# Altium footprint library 集大电协1.5.PcbLib: 227 footprints (part 18 of 18) (continued)
## 琴_LOGO [mm] (continued)

## 电力载波模块6410 [mm]
pads (24):
  round 1.3 hole 0.8: 0(35.059,-32.289) 0(35.059,-30.289) 0(35.059,-28.289) 0(35.059,-26.289) 0(35.059,-24.289) 0(35.059,-22.289) 0(35.059,-20.289) 0(35.059,-16.289) 2(1.059,-12.289) 3(1.059,-14.289) 4(1.059,-16.289) 5(1.059,-18.289) 6(1.059,-20.289) 7(1.059,-22.289) 8(1.059,-24.289) 9(1.059,-26.289) 10(1.059,-28.289) 11(1.059,-30.289) 12(1.059,-32.289) 13(35.059,-18.289) 14(35.059,-14.289) 15(35.059,-12.289) 16(35.059,-10.289)
  rect 1.3x1.3 hole 0.8: 1(1.059,-10.289)
Top Overlay:
  circle w0.254: c5,-7.5 r1.581
  lines w0.2: -0.016,-29.489 -0.016,-9.089 2.134,-9.089 2.134,-29.489 ; -0.016,-29.089 -0.016,-33.489 2.134,-33.489 2.134,-29.089 ; 33.984,-29.489 33.984,-9.089 36.134,-9.089 36.134,-29.489 ; 33.984,-29.089 33.984,-33.489 36.134,-33.489 36.134,-29.089
  lines w0.254: 16.5,0 16.5,-8.5 ccw(c17,-8.5) 17,-9 31,-9 ccw(c31,-8.5) 31.5,-8.5 31.5,0 ; 24.181,-9.068 24.181,-16.561 24.206,-16.561 25.908,-18.263 25.908,-19.279 25.908,-21.59 ; 25.933,-21.615 25.908,-21.59 ; 29.159,-9.144 29.159,-11.76 31.064,-13.665 31.064,-23.52 27.813,-23.52 25.908,-21.615 25.908,-21.59 ; -0.5,-37.5 ccw(c0.5,-37.5) 0.5,-38.5 35.5,-38.5 ccw(c35.5,-37.5) 36.5,-37.5 36.5,-1 ccw(c35.5,-1) 35.5,0 0.5,0 ccw(c0.5,-1) -0.5,-1 -0.5,-37.5
  text "NC" at 32.182,-14.63 h1.4
  text "NC" at 32.156,-12.675 h1.4
  text "AC/L" at 31.242,-18.745 h1.4
  text "AC/N" at 30.963,-10.541 h1.4
  text "GND" at 2.642,-32.766 h1.52
  text "12V" at 2.64,-30.773 h1.52
  text "RXN" at 2.54,-28.867 h1.52
  text "RXP" at 2.54,-26.86 h1.52
  text "TXN" at 2.542,-24.854 h1.52
  text "TXP" at 2.542,-22.847 h1.52
  text "3.3V" at 2.54,-20.826 h1.52
  text "PWR" at 2.54,-18.834 h1.52
  text "PLC" at 2.54,-16.813 h1.52
  text "ETH" at 2.54,-14.821 h1.52
  text "RST" at 2.54,-12.8 h1.52
  text "GND" at 2.642,-10.693 h1.52
Mechanical 13:
  lines w0.1: 0.059,-29.289 2.059,-29.289 ; 0.059,-29.289 0.059,-33.289 2.059,-33.289 2.059,-29.289 ; 0.059,-29.289 0.059,-9.289 2.059,-9.289 2.059,-29.289 ; 0.059,-29.289 2.059,-29.289 ; 34.059,-29.289 36.059,-29.289 ; 34.059,-29.289 34.059,-9.289 36.059,-9.289 36.059,-29.289 ; 34.059,-29.289 34.059,-33.289 36.059,-33.289 36.059,-29.289 ; 34.059,-29.289 36.059,-29.289
Mechanical 15:
  lines w0.05: 0.559,-31.289 1.559,-31.289 ; 0.559,-19.289 1.559,-19.289 ; 1.059,-31.789 1.059,-30.789 ; 1.059,-19.789 1.059,-18.789 ; 34.559,-31.289 35.559,-31.289 ; 34.559,-19.289 35.559,-19.289 ; 35.059,-31.789 35.059,-30.789 ; 35.059,-19.789 35.059,-18.789 ; -0.216,-33.689 -0.216,-28.889 2.334,-28.889 2.334,-33.689 -0.216,-33.689 ; -0.216,-29.689 -0.216,-8.889 2.334,-8.889 2.334,-29.689 -0.216,-29.689 ; 33.784,-33.689 36.334,-33.689 36.334,-28.889 33.784,-28.889 33.784,-33.689 ; 33.784,-29.689 36.334,-29.689 36.334,-8.889 33.784,-8.889 33.784,-29.689
3D body "62001011821.stp": height 4.35, standoff -2.65, extent 33.897,-29.42 36.397,-8.92
3D body "62000211821.stp": height 4.35, standoff -2.65, extent 33.887,-33.466 36.387,-28.966
3D body "62000211821.stp": height 4.35, standoff -2.65, extent -0.149,-33.416 2.351,-28.916
3D body "62001011821.stp": height 4.35, standoff -2.65, extent -0.139,-29.369 2.361,-8.869

## 电感 [mm]
pads (2):
  rect 2x2.5 smd: 1(-0.12,-0.044) 2(7.423,-0.069)
Top Overlay:
  lines w0.254: 0.19,-3.167 0.44,-3.417 6.69,-3.417 7.175,-2.932 7.175,3.098 6.69,3.583 0.69,3.583 0.19,3.083 0.19,-3.167
3D body "User Library-Inductor VLC6045 Series.STEP": height 4.5, standoff 0, extent 0.636,-2.981 6.636,3.019

## 电感 220uH(大) [mm]
pads (2):
  rect 5x10 smd: 1(-0.444,0.06) 2(-8.944,0.06)
Top Overlay:
  lines w0.127: -11.62,-6.09 -11.62,6.41 2.325,6.41 2.325,-6.09 -11.62,-6.09
3D body: height 4, standoff 0, extent -8.597,-3.279 -1.485,3.833

## 电量显示 [mm]
Top Layer:
  lines w0.051: -2.794,-4.445 -2.235,-4.445 ; -2.794,-4.394 -2.286,-4.394 ; -2.794,-4.343 -2.286,-4.343 ; -2.794,-4.293 -2.286,-4.293 ; -2.794,-4.242 -2.286,-4.242 ; -2.794,-4.191 -2.286,-4.191 ; -2.794,-4.14 -2.286,-4.14 ; -2.794,-4.089 -2.286,-4.089 ; -2.794,-4.039 -2.286,-4.039 ; -2.794,-3.988 -2.286,-3.988 ; -2.794,-3.937 -2.286,-3.937 ; -2.794,-3.886 -2.286,-3.886 ; -2.794,-3.835 -2.286,-3.835 ; -2.794,-3.785 -2.286,-3.785 ; -2.794,-3.734 -2.286,-3.734 ; -2.794,-3.683 -2.286,-3.683 ; -2.794,-3.632 -2.286,-3.632 ; -2.794,-3.581 -2.286,-3.581 ; -2.794,-3.531 -2.286,-3.531 ; -2.794,-3.48 -2.286,-3.48 ; -2.794,-3.429 -2.286,-3.429 ; -2.794,-3.378 -2.286,-3.378 ; -2.794,-3.327 -2.286,-3.327 ; -2.794,-3.277 -2.286,-3.277 ; -2.794,-3.226 -2.286,-3.226 ; -2.794,-3.175 -2.286,-3.175 ; -2.794,-3.124 -2.286,-3.124 ; -2.794,-3.073 -2.286,-3.073 ; -2.794,-3.023 -2.286,-3.023 ; -2.794,-2.972 -2.286,-2.972 ; -2.794,-2.921 -2.286,-2.921 ; -2.794,-2.87 -2.286,-2.87 ; -2.794,-2.819 -2.286,-2.819 ; -2.794,-2.769 -2.286,-2.769 ; -2.794,-2.718 -2.286,-2.718 ; -2.794,-2.667 -2.286,-2.667 ; -2.794,-2.616 -2.286,-2.616 ; -2.794,-2.565 -2.286,-2.565 ; -2.794,-2.515 -2.286,-2.515 ; -2.794,-2.464 -2.286,-2.464 ; -2.794,-2.413 -2.286,-2.413 ; -2.794,-2.362 -2.286,-2.362 ; -2.794,-2.311 -2.286,-2.311 ; -2.794,-2.261 -2.286,-2.261 ; -2.794,-2.21 -2.286,-2.21 ; -2.794,-2.159 -2.286,-2.159 ; -2.794,-2.108 -2.286,-2.108 ; -2.794,-2.057 -2.286,-2.057 ; -2.794,-2.007 -2.286,-2.007 ; -2.794,-1.956 -2.286,-1.956 ; -2.794,-1.905 -2.286,-1.905 ; -2.794,-1.854 -2.286,-1.854 ; -2.794,-1.803 -2.286,-1.803 ; -2.794,-1.753 -2.286,-1.753 ; -2.794,-1.702 -2.286,-1.702 ; -2.794,-1.651 -2.286,-1.651 ; -2.794,-1.6 -2.286,-1.6 ; -2.794,-1.549 -2.286,-1.549 ; -2.794,-1.499 -2.286,-1.499 ; -2.794,-1.448 -2.286,-1.448 ; -2.794,-1.397 -2.286,-1.397 ; -2.794,-1.346 -2.286,-1.346 ; -2.794,-1.295 -2.286,-1.295 ; -2.794,-1.245 -2.286,-1.245 ; -2.794,-1.194 -2.286,-1.194 ; -2.794,-1.143 -2.286,-1.143 ; -2.794,-1.092 -2.286,-1.092 ; -2.794,-1.041 -2.286,-1.041 ; -2.794,-0.991 -2.286,-0.991 ; -2.794,-0.94 -2.286,-0.94 ; -2.794,-0.889 -2.286,-0.889 ; -2.794,-0.838 -2.286,-0.838 ; -2.794,-0.787 -2.286,-0.787 ; -2.794,-0.737 -2.286,-0.737 ; -2.794,-0.686 -2.286,-0.686 ; -2.794,-0.635 -2.286,-0.635 ; -2.794,-0.584 -2.286,-0.584 ; -2.794,-0.533 -2.286,-0.533 ; -2.794,-0.483 -2.286,-0.483 ; -2.794,-0.432 -2.286,-0.432 ; -2.794,-0.381 -2.286,-0.381 ; -2.794,-0.33 -2.286,-0.33 ; -2.794,-0.279 -2.286,-0.279 ; -2.794,-0.229 -2.286,-0.229 ; -2.794,-0.178 -2.286,-0.178 ; -2.794,-0.127 -2.286,-0.127 ; -2.794,-0.076 -2.286,-0.076 ; -2.794,-0.025 -2.286,-0.025 ; -2.794,0.025 -2.286,0.025 ; -2.794,0.076 -2.286,0.076 ; -2.794,0.127 -2.286,0.127 ; -2.794,0.178 -2.286,0.178 ; -2.794,0.229 -2.286,0.229 ; -2.794,0.279 -2.286,0.279 ; -2.794,0.33 -2.286,0.33 ; -2.794,0.381 -2.286,0.381 ; -2.794,0.432 -2.286,0.432 ; -2.794,0.483 -2.286,0.483 ; -2.794,0.533 -2.286,0.533 ; -2.794,0.584 -2.286,0.584 ; -2.794,0.635 -2.286,0.635 ; -2.794,0.686 -2.286,0.686 ; -2.794,0.737 -2.286,0.737 ; -2.794,0.787 -2.286,0.787 ; -2.794,0.838 -2.286,0.838 ; -2.794,0.889 -2.286,0.889 ; -2.794,0.94 -2.286,0.94 ; -2.794,0.991 -2.286,0.991 ; -2.794,1.041 -2.286,1.041 ; -2.794,1.092 -2.286,1.092 ; -2.794,1.143 -2.286,1.143 ; -2.794,1.194 -2.286,1.194 ; -2.794,1.245 -2.286,1.245 ; -2.794,1.295 -2.286,1.295 ; -2.794,1.346 -2.286,1.346 ; -2.794,1.397 -2.286,1.397 ; -2.794,1.448 -2.286,1.448 ; -2.794,1.499 -2.286,1.499 ; -2.794,1.549 -2.286,1.549 ; -2.794,1.6 -2.286,1.6 ; -2.794,1.651 -2.286,1.651 ; -2.794,1.702 -2.286,1.702 ; -2.794,1.753 -2.286,1.753 ; -2.794,1.803 -2.286,1.803 ; -2.794,1.854 -2.286,1.854 ; -2.794,1.905 -2.286,1.905 ; -2.794,1.956 -2.286,1.956 ; -2.794,2.007 -2.286,2.007 ; -2.794,2.057 -2.286,2.057 ; -2.794,2.108 -2.286,2.108 ; -2.794,2.159 -2.286,2.159 ; -2.794,2.21 -2.286,2.21 ; -2.794,2.261 -2.286,2.261 ; -2.794,2.311 -2.286,2.311 ; -2.794,2.362 -2.286,2.362 ; -2.794,2.413 -2.286,2.413 ; -2.794,2.464 -2.286,2.464 ; -2.794,2.515 -2.286,2.515 ; -2.794,2.565 -2.286,2.565 ; -2.794,2.616 -2.286,2.616 ; -2.794,2.667 -2.286,2.667 ; -2.794,2.718 -2.286,2.718 ; -2.794,2.769 -2.286,2.769 ; -2.794,2.819 -2.286,2.819 ; -2.794,2.87 -2.286,2.87 ; -2.794,2.921 -2.286,2.921 ; -2.794,2.972 -2.286,2.972 ; -2.794,3.023 -2.286,3.023 ; -2.794,3.073 -2.286,3.073 ; -2.794,3.124 -2.286,3.124 ; -2.794,3.175 -2.286,3.175 ; -2.794,3.226 -2.286,3.226 ; -2.794,3.277 -2.286,3.277 ; -2.794,3.327 -2.286,3.327 ; -2.794,3.378 -2.286,3.378 ; -2.794,3.429 -2.286,3.429 ; -2.794,3.48 -2.286,3.48 ; -2.794,3.531 -2.286,3.531 ; -2.794,3.581 -2.235,3.581 ; -2.743,-4.597 -2.083,-4.597 ; -2.743,-4.547 -2.134,-4.547 ; -2.743,-4.496 -2.184,-4.496 ; -2.743,3.632 -2.184,3.632 ; -2.743,3.683 -2.134,3.683 ; -2.692,-4.699 2.489,-4.699 ; -2.692,-4.648 -1.93,-4.648 ; -2.692,3.734 -2.083,3.734 ; -2.692,3.785 -1.88,3.785 ; -2.642,-4.75 2.489,-4.75 ; -2.642,3.835 2.489,3.835 ; -2.642,3.886 2.438,3.886 ; -2.591,-4.801 2.438,-4.801 ; -2.591,3.937 2.388,3.937 ; -2.54,-4.902 2.337,-4.902 ; -2.54,-4.851 2.388,-4.851 ; -2.54,3.988 2.388,3.988 ; -2.489,4.039 2.337,4.039 ; -2.438,-4.953 2.286,-4.953 ; -2.438,4.089 2.235,4.089 ; -2.388,-5.004 2.184,-5.004 ; -2.388,4.14 2.184,4.14 ; -2.286,-5.055 2.134,-5.055 ; -2.286,4.191 2.083,4.191 ; -2.184,-5.105 2.032,-5.105 ; -2.134,4.242 1.981,4.242 ; -1.981,-4.293 1.829,-4.293 ; -1.981,-4.242 1.829,-4.242 ; -1.981,-4.191 1.829,-4.191 ; -1.981,-4.14 1.829,-4.14 ; -1.981,-4.089 1.829,-4.089 ; -1.981,-4.039 1.829,-4.039 ; -1.981,-3.988 1.829,-3.988 ; -1.981,-3.937 1.829,-3.937 ; -1.981,-3.886 1.829,-3.886 ; -1.981,-3.835 1.829,-3.835 ; -1.981,-3.785 1.829,-3.785 ; -1.981,-3.734 1.829,-3.734 ; -1.981,-3.683 1.829,-3.683 ; -1.981,-3.632 1.829,-3.632 ; -1.981,-3.581 1.829,-3.581 ; -1.981,-3.531 1.829,-3.531 ; -1.981,-3.48 1.829,-3.48 ; -1.981,-3.429 1.829,-3.429 ; -1.981,-3.378 1.829,-3.378 ; -1.981,-3.327 1.829,-3.327 ; -1.981,-3.277 1.829,-3.277 ; -1.981,-3.226 1.829,-3.226 ; -1.981,-3.175 1.829,-3.175 ; -1.981,-3.124 1.829,-3.124 ; -1.981,-3.073 1.829,-3.073 ; -1.981,-2.667 1.829,-2.667 ; -1.981,-2.616 1.829,-2.616 ; -1.981,-2.565 1.829,-2.565 ; -1.981,-2.515 1.829,-2.515 ; -1.981,-2.464 1.829,-2.464 ; -1.981,-2.413 1.829,-2.413 ; -1.981,-2.362 1.829,-2.362 ; -1.981,-2.311 1.829,-2.311 ; -1.981,-2.261 1.829,-2.261 ; -1.981,-2.21 1.829,-2.21 ; -1.981,-2.159 1.829,-2.159 ; -1.981,-2.108 1.829,-2.108 ; -1.981,-2.057 1.829,-2.057 ; -1.981,-2.007 1.829,-2.007 ; -1.981,-1.956 1.829,-1.956 ; -1.981,-1.905 1.829,-1.905 ; -1.981,-1.854 1.829,-1.854 ; -1.981,-1.803 1.829,-1.803 ; -1.981,-1.753 1.829,-1.753 ; -1.981,-1.702 1.829,-1.702 ; -1.981,-1.651 1.829,-1.651 ; -1.981,-1.6 1.829,-1.6 ; -1.981,-1.549 1.829,-1.549 ; -1.981,-1.499 1.829,-1.499 ; -1.981,-1.448 1.829,-1.448 ; -1.981,-1.041 1.829,-1.041 ; -1.981,-0.991 1.829,-0.991 ; -1.981,-0.94 1.829,-0.94 ; -1.981,-0.889 1.829,-0.889 ; -1.981,-0.838 1.829,-0.838 ; -1.981,-0.787 1.829,-0.787 ; -1.981,-0.737 1.829,-0.737 ; -1.981,-0.686 1.829,-0.686 ; -1.981,-0.635 1.829,-0.635 ; -1.981,-0.584 1.829,-0.584 ; -1.981,-0.533 1.829,-0.533 ; -1.981,-0.483 1.829,-0.483 ; -1.981,-0.432 1.829,-0.432 ; -1.981,-0.381 1.829,-0.381 ; -1.981,-0.33 1.829,-0.33 ; -1.981,-0.279 1.829,-0.279 ; -1.981,-0.229 1.829,-0.229 ; -1.981,-0.178 1.829,-0.178 ; -1.981,-0.127 1.829,-0.127 ; -1.981,-0.076 1.829,-0.076 ; -1.981,-0.025 1.829,-0.025 ; -1.981,0.025 1.829,0.025 ; -1.981,0.076 1.829,0.076 ; -1.981,0.127 1.829,0.127 ; -1.981,0.178 1.829,0.178 ; -1.981,0.635 1.829,0.635 ; -1.981,0.686 1.829,0.686 ; -1.981,0.737 1.829,0.737 ; -1.981,0.787 1.829,0.787 ; -1.981,0.838 1.829,0.838 ; -1.981,0.889 1.829,0.889 ; -1.981,0.94 1.829,0.94 ; -1.981,0.991 1.829,0.991 ; -1.981,1.041 1.829,1.041 ; -1.981,1.092 1.829,1.092 ; -1.981,1.143 1.829,1.143 ; -1.981,1.194 1.829,1.194 ; -1.981,1.245 1.829,1.245 ; -1.981,1.295 1.829,1.295 ; -1.981,1.346 1.829,1.346 ; -1.981,1.397 1.829,1.397 ; -1.981,1.448 1.829,1.448 ; -1.981,1.499 1.829,1.499 ; -1.981,1.549 1.829,1.549 ; -1.981,1.6 1.829,1.6 ; -1.981,1.651 1.829,1.651 ; -1.981,1.702 1.829,1.702 ; -1.981,1.753 1.829,1.753 ; -1.981,1.803 1.829,1.803 ; -1.981,1.854 1.829,1.854 ; -1.016,4.293 0.813,4.293 ; -1.016,4.343 0.813,4.343 ; -0.965,4.394 0.813,4.394 ; -0.965,4.445 0.813,4.445 ; -0.965,4.496 0.762,4.496 ; -0.914,4.547 0.711,4.547 ; -0.864,4.597 0.711,4.597 ; -0.813,4.648 0.61,4.648 ; -0.66,4.699 0.508,4.699 ; 1.676,3.785 2.489,3.785 ; 1.778,-4.648 2.54,-4.648 ; 1.88,-4.597 2.54,-4.597 ; 1.88,3.734 2.54,3.734 ; 1.981,-4.547 2.54,-4.547 ; 1.981,3.683 2.54,3.683 ; 2.032,-4.496 2.591,-4.496 ; 2.032,3.581 2.591,3.581 ; 2.032,3.632 2.591,3.632 ; 2.083,-4.445 2.591,-4.445 ; 2.083,-4.394 2.591,-4.394 ; 2.083,-4.343 2.591,-4.343 ; 2.083,3.48 2.591,3.48 ; 2.083,3.531 2.591,3.531 ; 2.134,-4.293 2.591,-4.293 ; 2.134,-4.242 2.591,-4.242 ; 2.134,-4.191 2.591,-4.191 ; 2.134,-4.14 2.591,-4.14 ; 2.134,-4.089 2.591,-4.089 ; 2.134,-4.039 2.591,-4.039 ; 2.134,-3.988 2.591,-3.988 ; 2.134,-3.937 2.591,-3.937 ; 2.134,-3.886 2.591,-3.886 ; 2.134,-3.835 2.591,-3.835 ; 2.134,-3.785 2.591,-3.785 ; 2.134,-3.734 2.591,-3.734 ; 2.134,-3.683 2.591,-3.683 ; 2.134,-3.632 2.591,-3.632 ; 2.134,-3.581 2.591,-3.581 ; 2.134,-3.531 2.591,-3.531 ; 2.134,-3.48 2.591,-3.48 ; 2.134,-3.429 2.591,-3.429 ; 2.134,-3.378 2.591,-3.378 ; 2.134,-3.327 2.591,-3.327 ; 2.134,-3.277 2.591,-3.277 ; 2.134,-3.226 2.591,-3.226 ; 2.134,-3.175 2.591,-3.175 ; 2.134,-3.124 2.591,-3.124 ; 2.134,-3.073 2.591,-3.073 ; 2.134,-3.023 2.591,-3.023 ; 2.134,-2.972 2.591,-2.972 ; 2.134,-2.921 2.591,-2.921 ; 2.134,-2.87 2.591,-2.87 ; 2.134,-2.819 2.591,-2.819 ; 2.134,-2.769 2.591,-2.769 ; 2.134,-2.718 2.591,-2.718 ; 2.134,-2.667 2.591,-2.667 ; 2.134,-2.616 2.591,-2.616 ; 2.134,-2.565 2.591,-2.565 ; 2.134,-2.515 2.591,-2.515 ; 2.134,-2.464 2.591,-2.464 ; 2.134,-2.413 2.591,-2.413 ; 2.134,-2.362 2.591,-2.362 ; 2.134,-2.311 2.591,-2.311 ; 2.134,-2.261 2.591,-2.261 ; 2.134,-2.21 2.591,-2.21 ; 2.134,-2.159 2.591,-2.159 ; 2.134,-2.108 2.591,-2.108 ; 2.134,-2.057 2.591,-2.057 ; 2.134,-2.007 2.591,-2.007 ; 2.134,-1.956 2.591,-1.956 ; 2.134,-1.905 2.591,-1.905 ; 2.134,-1.854 2.591,-1.854 ; 2.134,-1.803 2.591,-1.803 ; 2.134,-1.753 2.591,-1.753 ; 2.134,-1.702 2.591,-1.702 ; 2.134,-1.651 2.591,-1.651 ; 2.134,-1.6 2.591,-1.6 ; 2.134,-1.549 2.591,-1.549 ; 2.134,-1.499 2.591,-1.499 ; 2.134,-1.448 2.591,-1.448 ; 2.134,-1.397 2.591,-1.397 ; 2.134,-1.346 2.591,-1.346 ; 2.134,-1.295 2.591,-1.295 ; 2.134,-1.245 2.591,-1.245 ; 2.134,-1.194 2.591,-1.194 ; 2.134,-1.143 2.591,-1.143 ; 2.134,-1.092 2.591,-1.092 ; 2.134,-1.041 2.591,-1.041 ; 2.134,-0.991 2.591,-0.991 ; 2.134,-0.94 2.591,-0.94 ; 2.134,-0.889 2.591,-0.889 ; 2.134,-0.838 2.591,-0.838 ; 2.134,-0.787 2.591,-0.787 ; 2.134,-0.737 2.591,-0.737 ; 2.134,-0.686 2.591,-0.686 ; 2.134,-0.635 2.591,-0.635 ; 2.134,-0.584 2.591,-0.584 ; 2.134,-0.533 2.591,-0.533 ; 2.134,-0.483 2.591,-0.483 ; 2.134,-0.432 2.591,-0.432 ; 2.134,-0.381 2.591,-0.381 ; 2.134,-0.33 2.591,-0.33 ; 2.134,-0.279 2.591,-0.279 ; 2.134,-0.229 2.591,-0.229 ; 2.134,-0.178 2.591,-0.178 ; 2.134,-0.127 2.591,-0.127 ; 2.134,-0.076 2.591,-0.076 ; 2.134,-0.025 2.591,-0.025 ; 2.134,0.025 2.591,0.025 ; 2.134,0.076 2.591,0.076 ; 2.134,0.127 2.591,0.127 ; 2.134,0.178 2.591,0.178 ; 2.134,0.229 2.591,0.229 ; 2.134,0.279 2.591,0.279 ; 2.134,0.33 2.591,0.33 ; 2.134,0.381 2.591,0.381 ; 2.134,0.432 2.591,0.432 ; 2.134,0.483 2.591,0.483 ; 2.134,0.533 2.591,0.533 ; 2.134,0.584 2.591,0.584 ; 2.134,0.635 2.591,0.635 ; 2.134,0.686 2.591,0.686 ; 2.134,0.737 2.591,0.737 ; 2.134,0.787 2.591,0.787 ; 2.134,0.838 2.591,0.838 ; 2.134,0.889 2.591,0.889 ; 2.134,0.94 2.591,0.94 ; 2.134,0.991 2.591,0.991 ; 2.134,1.041 2.591,1.041 ; 2.134,1.092 2.591,1.092 ; 2.134,1.143 2.591,1.143 ; 2.134,1.194 2.591,1.194 ; 2.134,1.245 2.591,1.245 ; 2.134,1.295 2.591,1.295 ; 2.134,1.346 2.591,1.346 ; 2.134,1.397 2.591,1.397 ; 2.134,1.448 2.591,1.448 ; 2.134,1.499 2.591,1.499 ; 2.134,1.549 2.591,1.549 ; 2.134,1.6 2.591,1.6 ; 2.134,1.651 2.591,1.651 ; 2.134,1.702 2.591,1.702 ; 2.134,1.753 2.591,1.753 ; 2.134,1.803 2.591,1.803 ; 2.134,1.854 2.591,1.854 ; 2.134,1.905 2.591,1.905 ; 2.134,1.956 2.591,1.956 ; 2.134,2.007 2.591,2.007 ; 2.134,2.057 2.591,2.057 ; 2.134,2.108 2.591,2.108 ; 2.134,2.159 2.591,2.159 ; 2.134,2.21 2.591,2.21 ; 2.134,2.261 2.591,2.261 ; 2.134,2.311 2.591,2.311 ; 2.134,2.362 2.591,2.362 ; 2.134,2.413 2.591,2.413 ; 2.134,2.464 2.591,2.464 ; 2.134,2.515 2.591,2.515 ; 2.134,2.565 2.591,2.565 ; 2.134,2.616 2.591,2.616 ; 2.134,2.667 2.591,2.667 ; 2.134,2.718 2.591,2.718 ; 2.134,2.769 2.591,2.769 ; 2.134,2.819 2.591,2.819 ; 2.134,2.87 2.591,2.87 ; 2.134,2.921 2.591,2.921 ; 2.134,2.972 2.591,2.972 ; 2.134,3.023 2.591,3.023 ; 2.134,3.073 2.591,3.073 ; 2.134,3.124 2.591,3.124 ; 2.134,3.175 2.591,3.175 ; 2.134,3.226 2.591,3.226 ; 2.134,3.277 2.591,3.277 ; 2.134,3.327 2.591,3.327 ; 2.134,3.378 2.591,3.378 ; 2.134,3.429 2.591,3.429

## 继电器 [mil]
pads (5):
  round 100 hole 60: 1(-2.19,-1.05) 2(237.81,-581.05) 3(-242.19,-581.05) 4(237.81,-81.05) 5(-242.19,-81.05)
Top Overlay:
  lines w10: -342.19,58.95 -342.19,118.95 337.81,118.95 ; -342.19,78.95 -342.19,-701.05 337.81,-701.05 337.81,78.95 337.81,118.95 ; -262.19,118.95 337.81,118.95
3D body "继电器.ST": height 587.01, standoff -98.43, extent -330.71,-732.28 334.65,133.86

## 继电器(小型) [mil] "F3AA (20mm*7mm)"
pads (4):
  round 60 hole 30: 1(454.72,-186.02) 3(729.33,-186.02) 4(1.97,-0.98) 5(108.27,-0.98)
Top Overlay:
  lines w10: -49.21,-235.24 -49.21,48.23 781.5,48.23 781.5,-235.24 -49.21,-235.24
  text "F3AA" at 597.44,-14.76 h78.74
  text "COM" at 257.87,-211.61 h78.74
Mechanical 1:
3D body: height 590.55, standoff 0, extent -50.2,-232.28 780.51,49.21

## 继电器外形框 [mm]
pads (4):
  round 3 hole 3: 0(0,-40) 0(21,-40)
  round 3.1 hole 3.1: 0(0,5) 0(21,5)
Top Overlay:
  lines w0.254: -2.5,-42.5 23.5,-42.5 23.5,7.5 7.5,7.5 -2.5,7.5 -2.5,-42.5
3D body: height 20, standoff 10, extent -2.5,-42.5 23.5,7.5
3D body: height 15, standoff 0, extent -1.542,3.452 1.55,6.548
3D body: height 15, standoff 0, extent 19.458,3.452 22.55,6.548
3D body: height 15, standoff 0, extent 19.458,-41.548 22.55,-38.452
3D body: height 15, standoff 0, extent -1.542,-41.548 1.55,-38.452
3D body: height 25, standoff 15, extent 4.5,-35 17.5,-17.5

## 贴片按键 [mil]
pads (2):
  oval 80x40 smd: 1(-5.71,2.8) 2(294.29,2.8)
Top Overlay:
  lines w7: 14.13,-27.2 14.13,-75.94 274.19,-75.94 274.45,-27.21 ; 14.13,32.8 14.13,81.54 274.29,81.54 274.29,32.8
3D body: height 47.24, standoff 31.5, extent 94.29,-27.2 194.29,32.8
3D body "TVBU19.STEP": height 98.43, standoff 0, extent 24.22,-69.03 264.38,76.64

## 贴片排针(1.3mm) [mm]
pads (26):
  rect 2.3x0.7 smd: 1(0,0)
  oval 2.3x0.7 smd: 2(0,-1.3) 3(0,-2.6) 4(0,-3.9) 5(0,-5.2) 6(0,-6.5) 7(0,-7.8) 8(0,-9.1) 9(0,-10.4) 10(0,-11.7) 11(0,-13) 12(0,-14.3) 13(0,-15.6) 14(3.85,-15.6) 15(3.85,-14.3) 16(3.85,-13) 17(3.85,-11.7) 18(3.85,-10.4) 19(3.85,-9.1) 20(3.85,-7.8) 21(3.85,-6.5) 22(3.85,-5.2) 23(3.85,-3.9) 24(3.85,-2.6) 25(3.85,-1.3) 26(3.85,0)
Top Overlay:
  lines w0.2: -1.626,-16.586 5.461,-16.586 5.461,1.041 2.25,1.041 2.25,0.65 cw(c1.925,0.65) 1.6,0.65 1.6,1.041 -1.626,1.041 -1.626,-16.586

## 贴片电感 [mm]
pads (2):
  rect 2x2.5 smd: 1(-0.048,0.065) 2(7.496,0.04)
Top Overlay:
  lines w0.254: 0.262,-3.058 0.512,-3.308 6.762,-3.308 7.247,-2.823 7.247,3.207 6.762,3.692 0.762,3.692 0.262,3.192 0.262,-3.058
3D body "User Library-Inductor VLC6045 Series.STEP": height 4.5, standoff 0, extent 0.709,-2.873 6.709,3.127

## 钮子开关(大) [mm]
pads (3):
  rrect50% 2x3.5 hole 1 slot 2.5 at 90 deg: 1(-0.102,-0.025) 2(4.598,-0.025) 3(9.298,-0.025)
Top Overlay:
  lines w0.254: 10.817,4.175 11.071,4.175 ; 11.071,4.175 11.325,4.175 11.833,3.667 11.833,-0.143 11.833,-3.699 11.325,-4.207 -2.137,-4.207 -2.645,-3.699 -2.645,3.667 -2.137,4.175 11.071,4.175

## 钮子开关(小) [mm]
pads (3):
  rrect50% 1.5x3 hole 1 slot 1.8 at 90 deg: 1(0,0) 2(3,0) 3(6,0)
Top Overlay:
  lines w0.2: -1.064,-1.936 -1.064,1.936 -0.5,2.5 6.5,2.5 7.064,1.936 7.064,-1.936 6.5,-2.5 3,-2.5 -0.5,-2.5 -1.064,-1.936